# Altium footprint library hphonglib.PcbLib: 1250 footprints (part 69 of 79)
Each footprint in its own frame and in the unit in brackets; x right, y up, seen from the top. Pads: shape width x height; smd on the part's side, far side on the other; paste and mask are expansions set on the pad; w line width, h text height; cw(c..) or ccw(c..) is an arc to the next point about the centre after c.
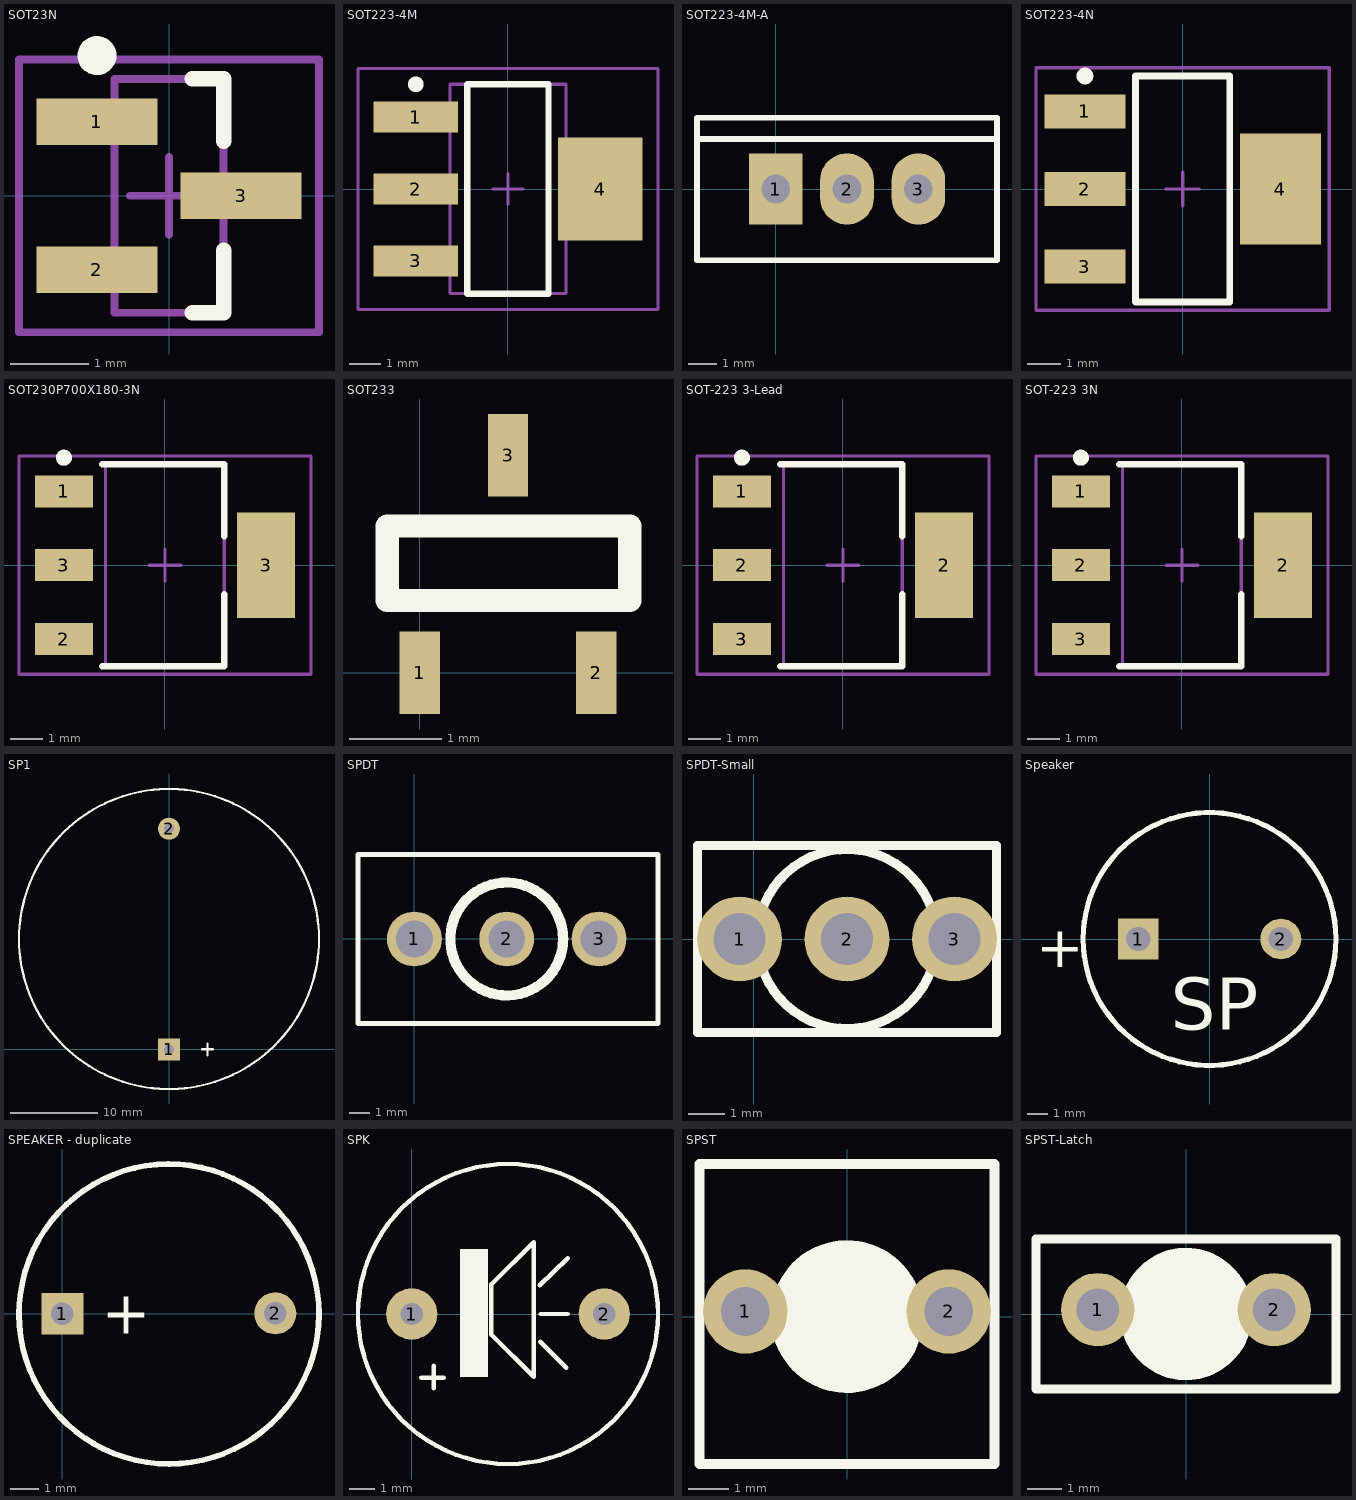
[diagram p68: the footprints below, top view; thin cyan lines are the x and y axes]

## SOT23N [mm] "SOT23, 3-Leads, Body 3.0x2.6mm (max), Pitch 0.95mm, IPC Medium Density"
height 1.1
pads (3):
  rect 1.55x0.6 smd: 1(-0.925,0.95) 2(-0.925,-0.95) 3(0.925,0)
Top Overlay:
  circle w0.25: c-0.925,1.8 r0.125
  lines w0.2: 0.3,-1.5 0.7,-1.5 0.7,-0.7 ; 0.3,1.5 0.7,1.5 0.7,0.7
Mechanical 13:
  lines w0.1: -0.7,-1.5 0.7,-1.5 0.7,1.5 -0.7,1.5 -0.7,-1.5
Mechanical 15:
  lines w0.1: -0.5,0 0.5,0 ; 0,-0.5 0,0.5 ; -1.925,-1.75 1.925,-1.75 1.925,1.75 -1.925,1.75 -1.925,-1.75
3D body "SOT-23.STEP": height 1.05, standoff -0.05, extent -1.27,-1.5 1.23,1.5

## SOT223-4M [mm] "SOT223, 4-Leads, Body 6.5x3.5mm, Pitch 2.3mm, Lead Span 7mm, IPC Low Density"
height 1.8
pads (4):
  rect 2.7x1 smd: 1(-2.95,2.3) 2(-2.95,0) 3(-2.95,-2.3)
  rect 2.7x3.3 smd: 4(2.95,0)
Top Overlay:
  circle w0.25: c-2.95,3.35 r0.125
  lines w0.2: -1.3,-3.35 1.3,-3.35 1.3,3.35 -1.3,3.35 -1.3,-3.35
Mechanical 13:
  lines w0.1: -1.85,-3.35 1.85,-3.35 1.85,3.35 -1.85,3.35 -1.85,-3.35
Mechanical 15:
  lines w0.1: -0.5,0 0.5,0 ; 0,-0.5 0,0.5 ; -4.8,-3.85 4.8,-3.85 4.8,3.85 -4.8,3.85 -4.8,-3.85
3D body "SOT-223-4.step": height 1.66, standoff -0.02, extent -3.48,-3.25 3.48,3.25

## SOT223-4M-A [mil] "SOT223, 4-Leads, Adaptor; Solder Pad 35mil"
pads (3):
  rect 75x100 hole 40: 1(0,0)
  oval 75x100 hole 40: 2(100,0) 3(200,0)
Top Overlay:
  lines w7.87: -110,70 310,70 ; -110,-100 -110,100 310,100 310,-100 -110,-100
3D body "Samtec-SSW-103-01-F-S.step": height 335, standoff -104, extent -60,-47.5 260,47.51

## SOT223-4N [mm] "SOT223, 4-Leads, Body 6.5x3.5mm, Pitch 2.3mm, Lead Span 7mm, IPC Medium Density"
height 1.8
pads (4):
  rect 2.4x1 smd: 1(-2.9,2.3) 2(-2.9,0) 3(-2.9,-2.3)
  rect 2.4x3.3 smd: 4(2.9,0)
Top Overlay:
  circle w0.25: c-2.9,3.35 r0.125
  lines w0.2: -1.4,-3.35 -1.4,3.35 1.4,3.35 1.4,-3.35 -1.4,-3.35
Mechanical 15:
  lines w0.1: -0.5,0 0.5,0 ; 0,-0.5 0,0.5 ; -4.35,-3.6 -4.35,3.6 4.35,3.6 4.35,-3.6 -4.35,-3.6
3D body "SW3dPS-Regulator.STEP": height 1.72, standoff 0.02, extent -3.395,-3.274 3.496,3.226

## SOT230P700X180-3N [mm] "SOT23, 3-Leads, Body 6.3x6.7mm (max), Pitch 2.30mm, IPC Medium Density"
height 1.8
pads (4):
  rect 1.8x1 smd: 1(-3.15,2.3) 2(-3.15,-2.3) 3(-3.15,0)
  rect 1.8x3.3 smd: 3(3.15,0)
Top Overlay:
  circle w0.25: c-3.15,3.35 r0.125
  lines w0.2: -1.95,-3.15 1.85,-3.15 1.85,-0.9 ; -1.95,3.15 1.85,3.15 1.85,0.9
Mechanical 13:
  lines w0.1: -1.85,-3.15 -1.85,3.15 1.85,3.15 1.85,-3.15 -1.85,-3.15
Mechanical 15:
  lines w0.1: -0.5,0 0.5,0 ; 0,-0.5 0,0.5 ; -4.55,-3.4 -4.55,3.4 4.55,3.4 4.55,-3.4 -4.55,-3.4
3D body: height 1.8, standoff 0.1, extent -1.85,-3.15 1.85,3.15

## SOT233 [mm]
pads (3):
  rect 0.44x0.9 smd: 1(0,0) 2(1.92,0) 3(0.96,2.37)
Top Overlay:
  lines w0.254: -0.356,0.787 -0.356,1.6 2.286,1.6 2.286,0.787 -0.356,0.787
3D body "User Library-3-lead sot23-3.step": height 1.04, standoff 0.02, extent -0.495,-0.051 2.425,2.425

## SOT-223 3-Lead [mm]
height 1.8
pads (4):
  rect 1.8x1 smd: 1(-3.15,2.3) 2(-3.15,0) 3(-3.15,-2.3)
  rect 1.8x3.3 smd: 2(3.15,0)
Top Overlay:
  circle w0.25: c-3.15,3.35 r0.125
  lines w0.2: -1.95,-3.15 1.85,-3.15 1.85,-0.9 ; -1.95,3.15 1.85,3.15 1.85,0.9
Mechanical 13:
  lines w0.1: -1.85,-3.15 -1.85,3.15 1.85,3.15 1.85,-3.15 -1.85,-3.15
Mechanical 15:
  lines w0.1: -0.5,0 0.5,0 ; 0,-0.5 0,0.5 ; -4.55,-3.4 -4.55,3.4 4.55,3.4 4.55,-3.4 -4.55,-3.4
3D body: height 0.33, standoff 0.01, extent 1.825,-1.5 3.575,1.5
3D body: height 0.33, standoff 0.01, extent -3.55,-2.675 -1.8,-1.925
3D body: height 0.33, standoff 0.01, extent -3.55,-0.375 -1.8,0.375
3D body: height 0.33, standoff 0.01, extent -3.55,1.925 -1.8,2.675
3D body: height 1.75, standoff 0.1, extent -1.85,-3.15 1.85,3.15

## SOT-223 3N [mm]
height 1.8
pads (4):
  rect 1.8x1 smd: 1(-3.15,2.3) 2(-3.15,0) 3(-3.15,-2.3)
  rect 1.8x3.3 smd: 2(3.15,0)
Top Overlay:
  circle w0.25: c-3.15,3.35 r0.125
  lines w0.2: -1.95,-3.15 1.85,-3.15 1.85,-0.9 ; -1.95,3.15 1.85,3.15 1.85,0.9
Mechanical 13:
  lines w0.1: -1.85,-3.15 -1.85,3.15 1.85,3.15 1.85,-3.15 -1.85,-3.15
Mechanical 15:
  lines w0.1: -0.5,0 0.5,0 ; 0,-0.5 0,0.5 ; -4.55,-3.4 -4.55,3.4 4.55,3.4 4.55,-3.4 -4.55,-3.4
3D body "SOT-223-1.STEP": height 1.69, standoff 0.04, extent -3.525,-3.25 3.475,3.25

## SP1 [mil] "Speaker Telphone on Broad"
height 3
pads (2):
  rect 100x100 hole 45: 1(0,0)
  round 100 hole 45: 2(0,1000)
Top Overlay:
  circle w10: c0,500 r680
  lines w10: 150,0 200,0 ; 174,-28 174,26
3D body "Sonitron-SCS-32 p10-DEFAULT.STEP": height 382.53, standoff -227.75, extent -666.7,-174.54 652.2,1144.36

## SPDT [mil] "Single-Pole, Double-Throw Switch; Solder Pad 35mil"
pads (3):
  round 107 hole 72: 1(0,0) 2(180,0) 3(360,0)
Top Overlay:
  circle w20: c180,0 r110
  lines w10: -110,-165 475,-165 475,165 -110,165 -110,-165
3D body "SW3dPS-SWITCH SPDT_O_N_O.STEP": height 1126.73, standoff -95, extent -70,-233.46 430,233.47

## SPDT-Small [mil] "Single-Pole, Double-Throw Switch, Small Type; Solder Pad 35mil"
pads (3):
  round 91 hole 56: 1(-15,0) 2(100,0) 3(215,0)
Top Overlay:
  circle w10: c100,0 r96
  lines w10: -60,-100 260,-100 260,100 -60,100 -60,-100

## Speaker [mm] "Speaker footprint"
pads (2):
  rect 2x2 hole 1.2: 1(-3.5,0)
  round 2 hole 1.2: 2(3.5,0)
Top Overlay:
  circle w0.254: c0,0 r6.2
  text "+" at -8.509,-1.397 h2.03
  text "SP" at -1.905,-4.445 h2.54
Bottom Overlay:
  circle w0.254: c-0.025,0 r6.228
3D body: height 10.02, standoff 10, extent -2.025,-2.025 2.025,2.025
3D body: height 10, standoff 1, extent -6.2,-6.2 6.2,6.2

## SPEAKER - duplicate [mm]
pads (2):
  rect 1.5x1.5 hole 0.8: 1(0,0)
  round 1.5 hole 0.8: 2(7.62,0.013)
Top Overlay:
  lines w0.203: 7.724,3.67 ccw(c3.816,-0.008) 7.76,3.632
  text "+" at 1.41,-0.711 h1.52
3D body "User Library-Buzzer WST-1203UX.step": height 4.5, standoff -9.65, extent -2.215,-6 13.239,6

## SPK [mil] "Speaker Chip"
height 500
pads (2):
  round 80 hole 35: 1(0,0) 2(300,0)
Top Overlay:
  circle w7: c150,0 r233.73
  rectangle: 75,-98 119,101
  lines w7: 15,-99 50,-99 ; 34,-116 34,-81 ; 199.52,44.52 243,87 ; 200,-43 241,-84 ; 201,0 243,0 ; 124,-32 190,-98 190,112 124,46 124,-32
3D body "Sonitron-SCS-17 P10-DEFAULT.STEP": height 343.51, standoff -267.12, extent -221,-354.14 511.28,378.14

## SPST [mil] "Single-Pole, Single-Throw Switch; 2 Leads; Solder Pad 35mil"
pads (2):
  round 83 hole 48: 1(-100,5) 2(100,5)
Top Overlay:
  circle w80: c0,0 r35
  lines w10: -145,-145 -145,150 145,150 145,-145 -145,-145

## SPST-Latch [mil] "Single-Pole, Single-Throw Switch; 2 Leads; Solder Pad 35mil"
pads (2):
  round 83 hole 48: 1(-100,5) 2(100,5)
Top Overlay:
  circle w80: c0,0 r35
  lines w10: -170,-85 170,-85 170,85 -170,85 -170,-85